# Altium footprint library smd-ipc.PCBLIB: 363 footprints (part 22 of 27) (continued)
## SQFP-S-24X24-296 [mm] (continued)
Mechanical 27:
  lines w0.2: -13.9,-13.4 -13.9,13.9 13.9,13.9 13.9,-13.4 -13.9,-13.4

## SQFP-S-24X24-304 [mm]
pads (304):
  rect 0.17x1.6 smd: 1(-11.25,-12.6) 2(-10.95,-12.6) 3(-10.65,-12.6) 4(-10.35,-12.6) 5(-10.05,-12.6) 6(-9.75,-12.6) 7(-9.45,-12.6) 8(-9.15,-12.6) 9(-8.85,-12.6) 10(-8.55,-12.6) 11(-8.25,-12.6) 12(-7.95,-12.6) 13(-7.65,-12.6) 14(-7.35,-12.6) 15(-7.05,-12.6) 16(-6.75,-12.6) 17(-6.45,-12.6) 18(-6.15,-12.6) 19(-5.85,-12.6) 20(-5.55,-12.6) 21(-5.25,-12.6) 22(-4.95,-12.6) 23(-4.65,-12.6) 24(-4.35,-12.6) 25(-4.05,-12.6) 26(-3.75,-12.6) 27(-3.45,-12.6) 28(-3.15,-12.6) 29(-2.85,-12.6) 30(-2.55,-12.6) 31(-2.25,-12.6) 32(-1.95,-12.6) 33(-1.65,-12.6) 34(-1.35,-12.6) 35(-1.05,-12.6) 36(-0.75,-12.6) 37(-0.45,-12.6) 38(-0.15,-12.6) 39(0.15,-12.6) 40(0.45,-12.6) 41(0.75,-12.6) 42(1.05,-12.6) 43(1.35,-12.6) 44(1.65,-12.6) 45(1.95,-12.6) 46(2.25,-12.6) 47(2.55,-12.6) 48(2.85,-12.6) 49(3.15,-12.6) 50(3.45,-12.6) 51(3.75,-12.6) 52(4.05,-12.6) 53(4.35,-12.6) 54(4.65,-12.6) 55(4.95,-12.6) 56(5.25,-12.6) 57(5.55,-12.6) 58(5.85,-12.6) 59(6.15,-12.6) 60(6.45,-12.6) 61(6.75,-12.6) 62(7.05,-12.6) 63(7.35,-12.6) 64(7.65,-12.6) 65(7.95,-12.6) 66(8.25,-12.6) 67(8.55,-12.6) 68(8.85,-12.6) 69(9.15,-12.6) 70(9.45,-12.6) 71(9.75,-12.6) 72(10.05,-12.6) 73(10.35,-12.6) 74(10.65,-12.6) 75(10.95,-12.6) 76(11.25,-12.6) 153(11.25,12.6) 154(10.95,12.6) 155(10.65,12.6) 156(10.35,12.6) 157(10.05,12.6) 158(9.75,12.6) 159(9.45,12.6) 160(9.15,12.6) 161(8.85,12.6) 162(8.55,12.6) 163(8.25,12.6) 164(7.95,12.6) 165(7.65,12.6) 166(7.35,12.6) 167(7.05,12.6) 168(6.75,12.6) 169(6.45,12.6) 170(6.15,12.6) 171(5.85,12.6) 172(5.55,12.6) 173(5.25,12.6) 174(4.95,12.6) 175(4.65,12.6) 176(4.35,12.6) 177(4.05,12.6) 178(3.75,12.6) 179(3.45,12.6) 180(3.15,12.6) 181(2.85,12.6) 182(2.55,12.6) 183(2.25,12.6) 184(1.95,12.6) 185(1.65,12.6) 186(1.35,12.6) 187(1.05,12.6) 188(0.75,12.6) 189(0.45,12.6) 190(0.15,12.6) 191(-0.15,12.6) 192(-0.45,12.6) 193(-0.75,12.6) 194(-1.05,12.6) 195(-1.35,12.6) 196(-1.65,12.6) 197(-1.95,12.6) 198(-2.25,12.6) 199(-2.55,12.6) 200(-2.85,12.6) 201(-3.15,12.6) 202(-3.45,12.6) 203(-3.75,12.6) 204(-4.05,12.6) 205(-4.35,12.6) 206(-4.65,12.6) 207(-4.95,12.6) 208(-5.25,12.6) 209(-5.55,12.6) 210(-5.85,12.6) 211(-6.15,12.6) 212(-6.45,12.6) 213(-6.75,12.6) 214(-7.05,12.6) 215(-7.35,12.6) 216(-7.65,12.6) 217(-7.95,12.6) 218(-8.25,12.6) 219(-8.55,12.6) 220(-8.85,12.6) 221(-9.15,12.6) 222(-9.45,12.6) 223(-9.75,12.6) 224(-10.05,12.6) 225(-10.35,12.6) 226(-10.65,12.6) 227(-10.95,12.6) 228(-11.25,12.6)
  rect 1.6x0.17 smd: 77(12.6,-11.25) 78(12.6,-10.95) 79(12.6,-10.65) 80(12.6,-10.35) 81(12.6,-10.05) 82(12.6,-9.75) 83(12.6,-9.45) 84(12.6,-9.15) 85(12.6,-8.85) 86(12.6,-8.55) 87(12.6,-8.25) 88(12.6,-7.95) 89(12.6,-7.65) 90(12.6,-7.35) 91(12.6,-7.05) 92(12.6,-6.75) 93(12.6,-6.45) 94(12.6,-6.15) 95(12.6,-5.85) 96(12.6,-5.55) 97(12.6,-5.25) 98(12.6,-4.95) 99(12.6,-4.65) 100(12.6,-4.35) 101(12.6,-4.05) 102(12.6,-3.75) 103(12.6,-3.45) 104(12.6,-3.15) 105(12.6,-2.85) 106(12.6,-2.55) 107(12.6,-2.25) 108(12.6,-1.95) 109(12.6,-1.65) 110(12.6,-1.35) 111(12.6,-1.05) 112(12.6,-0.75) 113(12.6,-0.45) 114(12.6,-0.15) 115(12.6,0.15) 116(12.6,0.45) 117(12.6,0.75) 118(12.6,1.05) 119(12.6,1.35) 120(12.6,1.65) 121(12.6,1.95) 122(12.6,2.25) 123(12.6,2.55) 124(12.6,2.85) 125(12.6,3.15) 126(12.6,3.45) 127(12.6,3.75) 128(12.6,4.05) 129(12.6,4.35) 130(12.6,4.65) 131(12.6,4.95) 132(12.6,5.25) 133(12.6,5.55) 134(12.6,5.85) 135(12.6,6.15) 136(12.6,6.45) 137(12.6,6.75) 138(12.6,7.05) 139(12.6,7.35) 140(12.6,7.65) 141(12.6,7.95) 142(12.6,8.25) 143(12.6,8.55) 144(12.6,8.85) 145(12.6,9.15) 146(12.6,9.45) 147(12.6,9.75) 148(12.6,10.05) 149(12.6,10.35) 150(12.6,10.65) 151(12.6,10.95) 152(12.6,11.25) 229(-12.6,11.25) 230(-12.6,10.95) 231(-12.6,10.65) 232(-12.6,10.35) 233(-12.6,10.05) 234(-12.6,9.75) 235(-12.6,9.45) 236(-12.6,9.15) 237(-12.6,8.85) 238(-12.6,8.55) 239(-12.6,8.25) 240(-12.6,7.95) 241(-12.6,7.65) 242(-12.6,7.35) 243(-12.6,7.05) 244(-12.6,6.75) 245(-12.6,6.45) 246(-12.6,6.15) 247(-12.6,5.85) 248(-12.6,5.55) 249(-12.6,5.25) 250(-12.6,4.95) 251(-12.6,4.65) 252(-12.6,4.35) 253(-12.6,4.05) 254(-12.6,3.75) 255(-12.6,3.45) 256(-12.6,3.15) 257(-12.6,2.85) 258(-12.6,2.55) 259(-12.6,2.25) 260(-12.6,1.95) 261(-12.6,1.65) 262(-12.6,1.35) 263(-12.6,1.05) 264(-12.6,0.75) 265(-12.6,0.45) 266(-12.6,0.15) 267(-12.6,-0.15) 268(-12.6,-0.45) 269(-12.6,-0.75) 270(-12.6,-1.05) 271(-12.6,-1.35) 272(-12.6,-1.65) 273(-12.6,-1.95) 274(-12.6,-2.25) 275(-12.6,-2.55) 276(-12.6,-2.85) 277(-12.6,-3.15) 278(-12.6,-3.45) 279(-12.6,-3.75) 280(-12.6,-4.05) 281(-12.6,-4.35) 282(-12.6,-4.65) 283(-12.6,-4.95) 284(-12.6,-5.25) 285(-12.6,-5.55) 286(-12.6,-5.85) 287(-12.6,-6.15) 288(-12.6,-6.45) 289(-12.6,-6.75) 290(-12.6,-7.05) 291(-12.6,-7.35) 292(-12.6,-7.65) 293(-12.6,-7.95) 294(-12.6,-8.25) 295(-12.6,-8.55) 296(-12.6,-8.85) 297(-12.6,-9.15) 298(-12.6,-9.45) 299(-12.6,-9.75) 300(-12.6,-10.05) 301(-12.6,-10.35) 302(-12.6,-10.65) 303(-12.6,-10.95) 304(-12.6,-11.25)
Top Overlay:
  circle w0.254: c-10.5,-10.5 r0.75
  lines w0.203: -11.72,-11.71 11.71,-11.71 11.71,11.71 -11.72,11.71 -11.72,-11.71
Mechanical 16:
  drawing of 308 lines, arcs and shapes, not listed
Mechanical 27:
  lines w0.2: -13.9,-13.4 -13.9,13.9 13.9,13.9 13.9,-13.4 -13.9,-13.4

## SQFP-S-28X28-120 [mm]
pads (120):
  rect 0.5x1.8 smd: 1(-11.6,-15) 2(-10.8,-15) 3(-10,-15) 4(-9.2,-15) 5(-8.4,-15) 6(-7.6,-15) 7(-6.8,-15) 8(-6,-15) 9(-5.2,-15) 10(-4.4,-15) 11(-3.6,-15) 12(-2.8,-15) 13(-2,-15) 14(-1.2,-15) 15(-0.4,-15) 16(0.4,-15) 17(1.2,-15) 18(2,-15) 19(2.8,-15) 20(3.6,-15) 21(4.4,-15) 22(5.2,-15) 23(6,-15) 24(6.8,-15) 25(7.6,-15) 26(8.4,-15) 27(9.2,-15) 28(10,-15) 29(10.8,-15) 30(11.6,-15) 61(11.6,15) 62(10.8,15) 63(10,15) 64(9.2,15) 65(8.4,15) 66(7.6,15) 67(6.8,15) 68(6,15) 69(5.2,15) 70(4.4,15) 71(3.6,15) 72(2.8,15) 73(2,15) 74(1.2,15) 75(0.4,15) 76(-0.4,15) 77(-1.2,15) 78(-2,15) 79(-2.8,15) 80(-3.6,15) 81(-4.4,15) 82(-5.2,15) 83(-6,15) 84(-6.8,15) 85(-7.6,15) 86(-8.4,15) 87(-9.2,15) 88(-10,15) 89(-10.8,15) 90(-11.6,15)
  rect 1.8x0.5 smd: 31(15,-11.6) 32(15,-10.8) 33(15,-10) 34(15,-9.2) 35(15,-8.4) 36(15,-7.6) 37(15,-6.8) 38(15,-6) 39(15,-5.2) 40(15,-4.4) 41(15,-3.6) 42(15,-2.8) 43(15,-2) 44(15,-1.2) 45(15,-0.4) 46(15,0.4) 47(15,1.2) 48(15,2) 49(15,2.8) 50(15,3.6) 51(15,4.4) 52(15,5.2) 53(15,6) 54(15,6.8) 55(15,7.6) 56(15,8.4) 57(15,9.2) 58(15,10) 59(15,10.8) 60(15,11.6) 91(-15,11.6) 92(-15,10.8) 93(-15,10) 94(-15,9.2) 95(-15,8.4) 96(-15,7.6) 97(-15,6.8) 98(-15,6) 99(-15,5.2) 100(-15,4.4) 101(-15,3.6) 102(-15,2.8) 103(-15,2) 104(-15,1.2) 105(-15,0.4) 106(-15,-0.4) 107(-15,-1.2) 108(-15,-2) 109(-15,-2.8) 110(-15,-3.6) 111(-15,-4.4) 112(-15,-5.2) 113(-15,-6) 114(-15,-6.8) 115(-15,-7.6) 116(-15,-8.4) 117(-15,-9.2) 118(-15,-10) 119(-15,-10.8) 120(-15,-11.6)
Top Overlay:
  circle w0.254: c-11.75,-12.75 r0.75
  lines w0.203: -14.17,-14.16 14.16,-14.16 14.16,14.16 -14.17,14.16 -14.17,-14.16
Mechanical 16:
  rectangle: -11.82,-15.9 -11.38,-14.45
  rectangle: -11.02,-15.9 -10.58,-14.45
  rectangle: -10.22,-15.9 -9.78,-14.45
  rectangle: -9.42,-15.9 -8.98,-14.45
  rectangle: -8.62,-15.9 -8.18,-14.45
  rectangle: -7.82,-15.9 -7.38,-14.45
  rectangle: -7.02,-15.9 -6.58,-14.45
  rectangle: -6.22,-15.9 -5.78,-14.45
  rectangle: -5.42,-15.9 -4.98,-14.45
  rectangle: -4.62,-15.9 -4.18,-14.45
  rectangle: -3.82,-15.9 -3.38,-14.45
  rectangle: -3.02,-15.9 -2.58,-14.45
  rectangle: -2.22,-15.9 -1.78,-14.45
  rectangle: -1.42,-15.9 -0.98,-14.45
  rectangle: -0.62,-15.9 -0.18,-14.45
  rectangle: 0.18,-15.9 0.62,-14.45
  rectangle: 0.98,-15.9 1.42,-14.45
  rectangle: 1.78,-15.9 2.22,-14.45
  rectangle: 2.58,-15.9 3.02,-14.45
  rectangle: 3.38,-15.9 3.82,-14.45
  rectangle: 4.18,-15.9 4.62,-14.45
  rectangle: 4.98,-15.9 5.42,-14.45
  rectangle: 5.78,-15.9 6.22,-14.45
  rectangle: 6.58,-15.9 7.02,-14.45
  rectangle: 7.38,-15.9 7.82,-14.45
  rectangle: 8.18,-15.9 8.62,-14.45
  rectangle: 8.98,-15.9 9.42,-14.45
  rectangle: 9.78,-15.9 10.22,-14.45
  rectangle: 10.58,-15.9 11.02,-14.45
  rectangle: 11.38,-15.9 11.82,-14.45
  rectangle: 14.45,-11.82 15.9,-11.38
  rectangle: 14.45,-11.02 15.9,-10.58
  rectangle: 14.45,-10.22 15.9,-9.78
  rectangle: 14.45,-9.42 15.9,-8.98
  rectangle: 14.45,-8.62 15.9,-8.18
  rectangle: 14.45,-7.82 15.9,-7.38
  rectangle: 14.45,-7.02 15.9,-6.58
  rectangle: 14.45,-6.22 15.9,-5.78
  rectangle: 14.45,-5.42 15.9,-4.98
  rectangle: 14.45,-4.62 15.9,-4.18
  rectangle: 14.45,-3.82 15.9,-3.38
  rectangle: 14.45,-3.02 15.9,-2.58
  rectangle: 14.45,-2.22 15.9,-1.78
  rectangle: 14.45,-1.42 15.9,-0.98
  rectangle: 14.45,-0.62 15.9,-0.18
  rectangle: 14.45,0.18 15.9,0.62
  rectangle: 14.45,0.98 15.9,1.42
  rectangle: 14.45,1.78 15.9,2.22
  rectangle: 14.45,2.58 15.9,3.02
  rectangle: 14.45,3.38 15.9,3.82
  rectangle: 14.45,4.18 15.9,4.62
  rectangle: 14.45,4.98 15.9,5.42
  rectangle: 14.45,5.78 15.9,6.22
  rectangle: 14.45,6.58 15.9,7.02
  rectangle: 14.45,7.38 15.9,7.82
  rectangle: 14.45,8.18 15.9,8.62
  rectangle: 14.45,8.98 15.9,9.42
  rectangle: 14.45,9.78 15.9,10.22
  rectangle: 14.45,10.58 15.9,11.02
  rectangle: 14.45,11.38 15.9,11.82
  rectangle: 11.38,14.45 11.82,15.9
  rectangle: 10.58,14.45 11.02,15.9
  rectangle: 9.78,14.45 10.22,15.9
  rectangle: 8.98,14.45 9.42,15.9
  rectangle: 8.18,14.45 8.62,15.9
  rectangle: 7.38,14.45 7.82,15.9
  rectangle: 6.58,14.45 7.02,15.9
  rectangle: 5.78,14.45 6.22,15.9
  rectangle: 4.98,14.45 5.42,15.9
  rectangle: 4.18,14.45 4.62,15.9
  rectangle: 3.38,14.45 3.82,15.9
  rectangle: 2.58,14.45 3.02,15.9
  rectangle: 1.78,14.45 2.22,15.9
  rectangle: 0.98,14.45 1.42,15.9
  rectangle: 0.18,14.45 0.62,15.9
  rectangle: -0.62,14.45 -0.18,15.9
  rectangle: -1.42,14.45 -0.98,15.9
  rectangle: -2.22,14.45 -1.78,15.9
  rectangle: -3.02,14.45 -2.58,15.9
  rectangle: -3.82,14.45 -3.38,15.9
  rectangle: -4.62,14.45 -4.18,15.9
  rectangle: -5.42,14.45 -4.98,15.9
  rectangle: -6.22,14.45 -5.78,15.9
  rectangle: -7.02,14.45 -6.58,15.9
  rectangle: -7.82,14.45 -7.38,15.9
  rectangle: -8.62,14.45 -8.18,15.9
  rectangle: -9.42,14.45 -8.98,15.9
  rectangle: -10.22,14.45 -9.78,15.9
  rectangle: -11.02,14.45 -10.58,15.9
  rectangle: -11.82,14.45 -11.38,15.9
  rectangle: -15.9,11.38 -14.45,11.82
  rectangle: -15.9,10.58 -14.45,11.02
  rectangle: -15.9,9.78 -14.45,10.22
  rectangle: -15.9,8.98 -14.45,9.42
  rectangle: -15.9,8.18 -14.45,8.62
  rectangle: -15.9,7.38 -14.45,7.82
  rectangle: -15.9,6.58 -14.45,7.02
  rectangle: -15.9,5.78 -14.45,6.22
  rectangle: -15.9,4.98 -14.45,5.42
  rectangle: -15.9,4.18 -14.45,4.62
  rectangle: -15.9,3.38 -14.45,3.82
  rectangle: -15.9,2.58 -14.45,3.02
  rectangle: -15.9,1.78 -14.45,2.22
  rectangle: -15.9,0.98 -14.45,1.42
  rectangle: -15.9,0.18 -14.45,0.62
  rectangle: -15.9,-0.62 -14.45,-0.18
  rectangle: -15.9,-1.42 -14.45,-0.98
  rectangle: -15.9,-2.22 -14.45,-1.78
  rectangle: -15.9,-3.02 -14.45,-2.58
  rectangle: -15.9,-3.82 -14.45,-3.38
  rectangle: -15.9,-4.62 -14.45,-4.18
  rectangle: -15.9,-5.42 -14.45,-4.98
  rectangle: -15.9,-6.22 -14.45,-5.78
  rectangle: -15.9,-7.02 -14.45,-6.58
  rectangle: -15.9,-7.82 -14.45,-7.38
  rectangle: -15.9,-8.62 -14.45,-8.18
  rectangle: -15.9,-9.42 -14.45,-8.98
  rectangle: -15.9,-10.22 -14.45,-9.78
  rectangle: -15.9,-11.02 -14.45,-10.58
  rectangle: -15.9,-11.82 -14.45,-11.38
  lines w0.203: -14.36,-14.36 14.36,-14.36 14.36,14.36 -14.36,14.36 -14.36,-14.36
Mechanical 27:
  lines w0.2: -16.4,-16.4 -16.4,16.4 16.4,16.4 16.4,-16.4 -16.4,-16.4

## SQFP-S-28X28-128 [mm]
pads (128):
  rect 0.5x1.8 smd: 1(-12.4,-15) 2(-11.6,-15) 3(-10.8,-15) 4(-10,-15) 5(-9.2,-15) 6(-8.4,-15) 7(-7.6,-15) 8(-6.8,-15) 9(-6,-15) 10(-5.2,-15) 11(-4.4,-15) 12(-3.6,-15) 13(-2.8,-15) 14(-2,-15) 15(-1.2,-15) 16(-0.4,-15) 17(0.4,-15) 18(1.2,-15) 19(2,-15) 20(2.8,-15) 21(3.6,-15) 22(4.4,-15) 23(5.2,-15) 24(6,-15) 25(6.8,-15) 26(7.6,-15) 27(8.4,-15) 28(9.2,-15) 29(10,-15) 30(10.8,-15) 31(11.6,-15) 32(12.4,-15) 65(12.4,15) 66(11.6,15) 67(10.8,15) 68(10,15) 69(9.2,15) 70(8.4,15) 71(7.6,15) 72(6.8,15) 73(6,15) 74(5.2,15) 75(4.4,15) 76(3.6,15) 77(2.8,15) 78(2,15) 79(1.2,15) 80(0.4,15) 81(-0.4,15) 82(-1.2,15) 83(-2,15) 84(-2.8,15) 85(-3.6,15) 86(-4.4,15) 87(-5.2,15) 88(-6,15) 89(-6.8,15) 90(-7.6,15) 91(-8.4,15) 92(-9.2,15) 93(-10,15) 94(-10.8,15) 95(-11.6,15) 96(-12.4,15)
  rect 1.8x0.5 smd: 33(15,-12.4) 34(15,-11.6) 35(15,-10.8) 36(15,-10) 37(15,-9.2) 38(15,-8.4) 39(15,-7.6) 40(15,-6.8) 41(15,-6) 42(15,-5.2) 43(15,-4.4) 44(15,-3.6) 45(15,-2.8) 46(15,-2) 47(15,-1.2) 48(15,-0.4) 49(15,0.4) 50(15,1.2) 51(15,2) 52(15,2.8) 53(15,3.6) 54(15,4.4) 55(15,5.2) 56(15,6) 57(15,6.8) 58(15,7.6) 59(15,8.4) 60(15,9.2) 61(15,10) 62(15,10.8) 63(15,11.6) 64(15,12.4) 97(-15,12.4) 98(-15,11.6) 99(-15,10.8) 100(-15,10) 101(-15,9.2) 102(-15,8.4) 103(-15,7.6) 104(-15,6.8) 105(-15,6) 106(-15,5.2) 107(-15,4.4) 108(-15,3.6) 109(-15,2.8) 110(-15,2) 111(-15,1.2) 112(-15,0.4) 113(-15,-0.4) 114(-15,-1.2) 115(-15,-2) 116(-15,-2.8) 117(-15,-3.6) 118(-15,-4.4) 119(-15,-5.2) 120(-15,-6) 121(-15,-6.8) 122(-15,-7.6) 123(-15,-8.4) 124(-15,-9.2) 125(-15,-10) 126(-15,-10.8) 127(-15,-11.6) 128(-15,-12.4)
Top Overlay:
  circle w0.254: c-12.5,-12.75 r0.75
  lines w0.203: -14.17,-14.16 14.16,-14.16 14.16,14.16 -14.17,14.16 -14.17,-14.16
Mechanical 16:
  rectangle: -12.62,-15.9 -12.18,-14.45
  rectangle: -11.82,-15.9 -11.38,-14.45
  rectangle: -11.02,-15.9 -10.58,-14.45
  rectangle: -10.22,-15.9 -9.78,-14.45
  rectangle: -9.42,-15.9 -8.98,-14.45
  rectangle: -8.62,-15.9 -8.18,-14.45
  rectangle: -7.82,-15.9 -7.38,-14.45
  rectangle: -7.02,-15.9 -6.58,-14.45
  rectangle: -6.22,-15.9 -5.78,-14.45
  rectangle: -5.42,-15.9 -4.98,-14.45
  rectangle: -4.62,-15.9 -4.18,-14.45
  rectangle: -3.82,-15.9 -3.38,-14.45
  rectangle: -3.02,-15.9 -2.58,-14.45
  rectangle: -2.22,-15.9 -1.78,-14.45
  rectangle: -1.42,-15.9 -0.98,-14.45
  rectangle: -0.62,-15.9 -0.18,-14.45
  rectangle: 0.18,-15.9 0.62,-14.45
  rectangle: 0.98,-15.9 1.42,-14.45
  rectangle: 1.78,-15.9 2.22,-14.45
  rectangle: 2.58,-15.9 3.02,-14.45
  rectangle: 3.38,-15.9 3.82,-14.45
  rectangle: 4.18,-15.9 4.62,-14.45
  rectangle: 4.98,-15.9 5.42,-14.45
  rectangle: 5.78,-15.9 6.22,-14.45
  rectangle: 6.58,-15.9 7.02,-14.45
  rectangle: 7.38,-15.9 7.82,-14.45
  rectangle: 8.18,-15.9 8.62,-14.45
  rectangle: 8.98,-15.9 9.42,-14.45
  rectangle: 9.78,-15.9 10.22,-14.45
  rectangle: 10.58,-15.9 11.02,-14.45
  rectangle: 11.38,-15.9 11.82,-14.45
  rectangle: 12.18,-15.9 12.62,-14.45
  rectangle: 14.45,-12.62 15.9,-12.18
  rectangle: 14.45,-11.82 15.9,-11.38
  rectangle: 14.45,-11.02 15.9,-10.58
  rectangle: 14.45,-10.22 15.9,-9.78
  rectangle: 14.45,-9.42 15.9,-8.98
  rectangle: 14.45,-8.62 15.9,-8.18
  rectangle: 14.45,-7.82 15.9,-7.38
  rectangle: 14.45,-7.02 15.9,-6.58
  rectangle: 14.45,-6.22 15.9,-5.78
  rectangle: 14.45,-5.42 15.9,-4.98
  rectangle: 14.45,-4.62 15.9,-4.18
  rectangle: 14.45,-3.82 15.9,-3.38
  rectangle: 14.45,-3.02 15.9,-2.58
  rectangle: 14.45,-2.22 15.9,-1.78
  rectangle: 14.45,-1.42 15.9,-0.98
  rectangle: 14.45,-0.62 15.9,-0.18
  rectangle: 14.45,0.18 15.9,0.62
  rectangle: 14.45,0.98 15.9,1.42
  rectangle: 14.45,1.78 15.9,2.22
  rectangle: 14.45,2.58 15.9,3.02
  rectangle: 14.45,3.38 15.9,3.82
  rectangle: 14.45,4.18 15.9,4.62
  rectangle: 14.45,4.98 15.9,5.42
  rectangle: 14.45,5.78 15.9,6.22
  rectangle: 14.45,6.58 15.9,7.02
  rectangle: 14.45,7.38 15.9,7.82
  rectangle: 14.45,8.18 15.9,8.62
  rectangle: 14.45,8.98 15.9,9.42
  rectangle: 14.45,9.78 15.9,10.22
  rectangle: 14.45,10.58 15.9,11.02
  rectangle: 14.45,11.38 15.9,11.82
  rectangle: 14.45,12.18 15.9,12.62
  rectangle: 12.18,14.45 12.62,15.9
  rectangle: 11.38,14.45 11.82,15.9
  rectangle: 10.58,14.45 11.02,15.9
  rectangle: 9.78,14.45 10.22,15.9
  rectangle: 8.98,14.45 9.42,15.9
  rectangle: 8.18,14.45 8.62,15.9
  rectangle: 7.38,14.45 7.82,15.9
  rectangle: 6.58,14.45 7.02,15.9
  rectangle: 5.78,14.45 6.22,15.9
  rectangle: 4.98,14.45 5.42,15.9
  rectangle: 4.18,14.45 4.62,15.9
  rectangle: 3.38,14.45 3.82,15.9
  rectangle: 2.58,14.45 3.02,15.9
  rectangle: 1.78,14.45 2.22,15.9
  rectangle: 0.98,14.45 1.42,15.9
  rectangle: 0.18,14.45 0.62,15.9
  rectangle: -0.62,14.45 -0.18,15.9
  rectangle: -1.42,14.45 -0.98,15.9
  rectangle: -2.22,14.45 -1.78,15.9
  rectangle: -3.02,14.45 -2.58,15.9
  rectangle: -3.82,14.45 -3.38,15.9
  rectangle: -4.62,14.45 -4.18,15.9
  rectangle: -5.42,14.45 -4.98,15.9
  rectangle: -6.22,14.45 -5.78,15.9
  rectangle: -7.02,14.45 -6.58,15.9
  rectangle: -7.82,14.45 -7.38,15.9
  rectangle: -8.62,14.45 -8.18,15.9
  rectangle: -9.42,14.45 -8.98,15.9
  rectangle: -10.22,14.45 -9.78,15.9
  rectangle: -11.02,14.45 -10.58,15.9
  rectangle: -11.82,14.45 -11.38,15.9
  rectangle: -12.62,14.45 -12.18,15.9
  rectangle: -15.9,12.18 -14.45,12.62
  rectangle: -15.9,11.38 -14.45,11.82
  rectangle: -15.9,10.58 -14.45,11.02
  rectangle: -15.9,9.78 -14.45,10.22
  rectangle: -15.9,8.98 -14.45,9.42
  rectangle: -15.9,8.18 -14.45,8.62
  rectangle: -15.9,7.38 -14.45,7.82
  rectangle: -15.9,6.58 -14.45,7.02
  rectangle: -15.9,5.78 -14.45,6.22
  rectangle: -15.9,4.98 -14.45,5.42
  rectangle: -15.9,4.18 -14.45,4.62
  rectangle: -15.9,3.38 -14.45,3.82
  rectangle: -15.9,2.58 -14.45,3.02
  rectangle: -15.9,1.78 -14.45,2.22
  rectangle: -15.9,0.98 -14.45,1.42
  rectangle: -15.9,0.18 -14.45,0.62
  rectangle: -15.9,-0.62 -14.45,-0.18
  rectangle: -15.9,-1.42 -14.45,-0.98
  rectangle: -15.9,-2.22 -14.45,-1.78
  rectangle: -15.9,-3.02 -14.45,-2.58
  rectangle: -15.9,-3.82 -14.45,-3.38
  rectangle: -15.9,-4.62 -14.45,-4.18
  rectangle: -15.9,-5.42 -14.45,-4.98
  rectangle: -15.9,-6.22 -14.45,-5.78
  rectangle: -15.9,-7.02 -14.45,-6.58
  rectangle: -15.9,-7.82 -14.45,-7.38
  rectangle: -15.9,-8.62 -14.45,-8.18
  rectangle: -15.9,-9.42 -14.45,-8.98
  rectangle: -15.9,-10.22 -14.45,-9.78
  rectangle: -15.9,-11.02 -14.45,-10.58
  rectangle: -15.9,-11.82 -14.45,-11.38
  rectangle: -15.9,-12.62 -14.45,-12.18
  lines w0.203: -14.36,-14.36 14.36,-14.36 14.36,14.36 -14.36,14.36 -14.36,-14.36
Mechanical 27:
  lines w0.2: -16.4,-16.4 -16.4,16.4 16.4,16.4 16.4,-16.4 -16.4,-16.4

## SQFP-S-28X28-144 [mm]
pads (144):
  rect 0.4x1.8 smd: 1(-11.375,-15) 2(-10.725,-15) 3(-10.075,-15) 4(-9.425,-15) 5(-8.775,-15) 6(-8.125,-15) 7(-7.475,-15) 8(-6.825,-15) 9(-6.175,-15) 10(-5.525,-15) 11(-4.875,-15) 12(-4.225,-15) 13(-3.575,-15) 14(-2.925,-15) 15(-2.275,-15) 16(-1.625,-15) 17(-0.975,-15) 18(-0.325,-15) 19(0.325,-15) 20(0.975,-15) 21(1.625,-15) 22(2.275,-15) 23(2.925,-15) 24(3.575,-15) 25(4.225,-15) 26(4.875,-15) 27(5.525,-15) 28(6.175,-15) 29(6.825,-15) 30(7.475,-15) 31(8.125,-15) 32(8.775,-15) 33(9.425,-15) 34(10.075,-15) 35(10.725,-15) 36(11.375,-15) 73(11.375,15) 74(10.725,15) 75(10.075,15) 76(9.425,15) 77(8.775,15) 78(8.125,15) 79(7.475,15) 80(6.825,15) 81(6.175,15) 82(5.525,15) 83(4.875,15) 84(4.225,15) 85(3.575,15) 86(2.925,15) 87(2.275,15) 88(1.625,15) 89(0.975,15) 90(0.325,15) 91(-0.325,15) 92(-0.975,15) 93(-1.625,15) 94(-2.275,15) 95(-2.925,15) 96(-3.575,15) 97(-4.225,15) 98(-4.875,15) 99(-5.525,15) 100(-6.175,15) 101(-6.825,15) 102(-7.475,15) 103(-8.125,15) 104(-8.775,15) 105(-9.425,15) 106(-10.075,15) 107(-10.725,15) 108(-11.375,15)
  rect 1.8x0.4 smd: 37(15,-11.375) 38(15,-10.725) 39(15,-10.075) 40(15,-9.425) 41(15,-8.775) 42(15,-8.125) 43(15,-7.475) 44(15,-6.825) 45(15,-6.175) 46(15,-5.525) 47(15,-4.875) 48(15,-4.225) 49(15,-3.575) 50(15,-2.925) 51(15,-2.275) 52(15,-1.625) 53(15,-0.975) 54(15,-0.325) 55(15,0.325) 56(15,0.975) 57(15,1.625) 58(15,2.275) 59(15,2.925) 60(15,3.575) 61(15,4.225) 62(15,4.875) 63(15,5.525) 64(15,6.175) 65(15,6.825) 66(15,7.475) 67(15,8.125) 68(15,8.775) 69(15,9.425) 70(15,10.075) 71(15,10.725) 72(15,11.375) 109(-15,11.375) 110(-15,10.725) 111(-15,10.075) 112(-15,9.425) 113(-15,8.775) 114(-15,8.125) 115(-15,7.475) 116(-15,6.825) 117(-15,6.175) 118(-15,5.525) 119(-15,4.875) 120(-15,4.225) 121(-15,3.575) 122(-15,2.925) 123(-15,2.275) 124(-15,1.625) 125(-15,0.975) 126(-15,0.325) 127(-15,-0.325) 128(-15,-0.975) 129(-15,-1.625) 130(-15,-2.275) 131(-15,-2.925) 132(-15,-3.575) 133(-15,-4.225) 134(-15,-4.875) 135(-15,-5.525) 136(-15,-6.175) 137(-15,-6.825) 138(-15,-7.475) 139(-15,-8.125) 140(-15,-8.775) 141(-15,-9.425) 142(-15,-10.075) 143(-15,-10.725) 144(-15,-11.375)
Top Overlay:
  circle w0.254: c-11.5,-12.75 r0.75
  lines w0.203: -14.17,-14.16 14.16,-14.16 14.16,14.16 -14.17,14.16 -14.17,-14.16
Mechanical 16:
  rectangle: -11.565,-15.9 -11.195,-14.45
  rectangle: -10.915,-15.9 -10.545,-14.45
  rectangle: -10.265,-15.9 -9.895,-14.45
  rectangle: -9.615,-15.9 -9.245,-14.45
  rectangle: -8.965,-15.9 -8.595,-14.45
  rectangle: -8.315,-15.9 -7.945,-14.45
  rectangle: -7.665,-15.9 -7.295,-14.45
  rectangle: -7.015,-15.9 -6.645,-14.45
  rectangle: -6.365,-15.9 -5.995,-14.45
  rectangle: -5.715,-15.9 -5.345,-14.45
  rectangle: -5.065,-15.9 -4.695,-14.45
  rectangle: -4.415,-15.9 -4.045,-14.45
  rectangle: -3.765,-15.9 -3.395,-14.45
  rectangle: -3.115,-15.9 -2.745,-14.45
  rectangle: -2.465,-15.9 -2.095,-14.45
  rectangle: -1.815,-15.9 -1.445,-14.45
  rectangle: -1.165,-15.9 -0.795,-14.45
  rectangle: -0.515,-15.9 -0.145,-14.45
  rectangle: 0.135,-15.9 0.505,-14.45
  rectangle: 0.785,-15.9 1.155,-14.45
  rectangle: 1.435,-15.9 1.805,-14.45
  rectangle: 2.085,-15.9 2.455,-14.45
  rectangle: 2.735,-15.9 3.105,-14.45
  rectangle: 3.385,-15.9 3.755,-14.45
  rectangle: 4.035,-15.9 4.405,-14.45
  rectangle: 4.685,-15.9 5.055,-14.45
  rectangle: 5.335,-15.9 5.705,-14.45
  rectangle: 5.985,-15.9 6.355,-14.45
  rectangle: 6.635,-15.9 7.005,-14.45
  rectangle: 7.285,-15.9 7.655,-14.45
  rectangle: 7.935,-15.9 8.305,-14.45
  rectangle: 8.585,-15.9 8.955,-14.45
  rectangle: 9.235,-15.9 9.605,-14.45
  rectangle: 9.885,-15.9 10.255,-14.45
  rectangle: 10.535,-15.9 10.905,-14.45
  rectangle: 11.185,-15.9 11.555,-14.45
  rectangle: 14.45,-11.565 15.9,-11.195
  rectangle: 14.45,-10.915 15.9,-10.545
  rectangle: 14.45,-10.265 15.9,-9.895
  rectangle: 14.45,-9.615 15.9,-9.245
  rectangle: 14.45,-8.965 15.9,-8.595
  rectangle: 14.45,-8.315 15.9,-7.945
  rectangle: 14.45,-7.665 15.9,-7.295
  rectangle: 14.45,-7.015 15.9,-6.645
  rectangle: 14.45,-6.365 15.9,-5.995
  rectangle: 14.45,-5.715 15.9,-5.345
  rectangle: 14.45,-5.065 15.9,-4.695
  rectangle: 14.45,-4.415 15.9,-4.045
  rectangle: 14.45,-3.765 15.9,-3.395
  rectangle: 14.45,-3.115 15.9,-2.745
  rectangle: 14.45,-2.465 15.9,-2.095
  rectangle: 14.45,-1.815 15.9,-1.445
  rectangle: 14.45,-1.165 15.9,-0.795
  rectangle: 14.45,-0.515 15.9,-0.145
  rectangle: 14.45,0.135 15.9,0.505
  rectangle: 14.45,0.785 15.9,1.155
  rectangle: 14.45,1.435 15.9,1.805
  rectangle: 14.45,2.085 15.9,2.455
  rectangle: 14.45,2.735 15.9,3.105
  rectangle: 14.45,3.385 15.9,3.755
  rectangle: 14.45,4.035 15.9,4.405
  rectangle: 14.45,4.685 15.9,5.055
  rectangle: 14.45,5.335 15.9,5.705
  rectangle: 14.45,5.985 15.9,6.355
  rectangle: 14.45,6.635 15.9,7.005
  rectangle: 14.45,7.285 15.9,7.655
  rectangle: 14.45,7.935 15.9,8.305
  rectangle: 14.45,8.585 15.9,8.955
  rectangle: 14.45,9.235 15.9,9.605
  rectangle: 14.45,9.885 15.9,10.255
  rectangle: 14.45,10.535 15.9,10.905
  rectangle: 14.45,11.185 15.9,11.555
  rectangle: 11.195,14.45 11.565,15.9
  rectangle: 10.545,14.45 10.915,15.9
  rectangle: 9.895,14.45 10.265,15.9
  rectangle: 9.245,14.45 9.615,15.9
  rectangle: 8.595,14.45 8.965,15.9
  rectangle: 7.945,14.45 8.315,15.9
  rectangle: 7.295,14.45 7.665,15.9
  rectangle: 6.645,14.45 7.015,15.9
  rectangle: 5.995,14.45 6.365,15.9
  rectangle: 5.345,14.45 5.715,15.9
  rectangle: 4.695,14.45 5.065,15.9
  rectangle: 4.045,14.45 4.415,15.9
  rectangle: 3.395,14.45 3.765,15.9
  rectangle: 2.745,14.45 3.115,15.9
  rectangle: 2.095,14.45 2.465,15.9
  rectangle: 1.445,14.45 1.815,15.9
  rectangle: 0.795,14.45 1.165,15.9
  rectangle: 0.145,14.45 0.515,15.9
  rectangle: -0.505,14.45 -0.135,15.9
  rectangle: -1.155,14.45 -0.785,15.9
  rectangle: -1.805,14.45 -1.435,15.9
  rectangle: -2.455,14.45 -2.085,15.9
  rectangle: -3.105,14.45 -2.735,15.9
  rectangle: -3.755,14.45 -3.385,15.9
  rectangle: -4.405,14.45 -4.035,15.9
  rectangle: -5.055,14.45 -4.685,15.9
  rectangle: -5.705,14.45 -5.335,15.9
  rectangle: -6.355,14.45 -5.985,15.9
  rectangle: -7.005,14.45 -6.635,15.9
  rectangle: -7.655,14.45 -7.285,15.9
  rectangle: -8.305,14.45 -7.935,15.9
  rectangle: -8.955,14.45 -8.585,15.9
  rectangle: -9.605,14.45 -9.235,15.9
  rectangle: -10.255,14.45 -9.885,15.9
  rectangle: -10.905,14.45 -10.535,15.9
  rectangle: -11.555,14.45 -11.185,15.9
  rectangle: -15.9,11.195 -14.45,11.565
  rectangle: -15.9,10.545 -14.45,10.915
  rectangle: -15.9,9.895 -14.45,10.265
  rectangle: -15.9,9.245 -14.45,9.615
  rectangle: -15.9,8.595 -14.45,8.965
  rectangle: -15.9,7.945 -14.45,8.315
  rectangle: -15.9,7.295 -14.45,7.665
  rectangle: -15.9,6.645 -14.45,7.015
  rectangle: -15.9,5.995 -14.45,6.365
  rectangle: -15.9,5.345 -14.45,5.715
  rectangle: -15.9,4.695 -14.45,5.065
  rectangle: -15.9,4.045 -14.45,4.415
  rectangle: -15.9,3.395 -14.45,3.765
  rectangle: -15.9,2.745 -14.45,3.115
  rectangle: -15.9,2.095 -14.45,2.465
  rectangle: -15.9,1.445 -14.45,1.815
  rectangle: -15.9,0.795 -14.45,1.165
  rectangle: -15.9,0.145 -14.45,0.515
  rectangle: -15.9,-0.505 -14.45,-0.135
  rectangle: -15.9,-1.155 -14.45,-0.785
  rectangle: -15.9,-1.805 -14.45,-1.435
  rectangle: -15.9,-2.455 -14.45,-2.085
  rectangle: -15.9,-3.105 -14.45,-2.735
  rectangle: -15.9,-3.755 -14.45,-3.385
  rectangle: -15.9,-4.405 -14.45,-4.035
  rectangle: -15.9,-5.055 -14.45,-4.685
  rectangle: -15.9,-5.705 -14.45,-5.335
  rectangle: -15.9,-6.355 -14.45,-5.985
  rectangle: -15.9,-7.005 -14.45,-6.635
  rectangle: -15.9,-7.655 -14.45,-7.285
  rectangle: -15.9,-8.305 -14.45,-7.935
  rectangle: -15.9,-8.955 -14.45,-8.585
  rectangle: -15.9,-9.605 -14.45,-9.235
  rectangle: -15.9,-10.255 -14.45,-9.885
  rectangle: -15.9,-10.905 -14.45,-10.535
  rectangle: -15.9,-11.555 -14.45,-11.185
  lines w0.203: -14.36,-14.36 14.36,-14.36 14.36,14.36 -14.36,14.36 -14.36,-14.36
Mechanical 27:
  lines w0.2: -16.4,-16.4 -16.4,16.4 16.4,16.4 16.4,-16.4 -16.4,-16.4